# Altium footprint library SG__PCB_Modules.PcbLib: 73 footprints (part 3 of 5)
Each footprint in its own frame and in the unit in brackets; x right, y up, seen from the top. Pads: shape width x height; smd on the part's side, far side on the other; paste and mask are expansions set on the pad; w line width, h text height; cw(c..) or ccw(c..) is an arc to the next point about the centre after c.
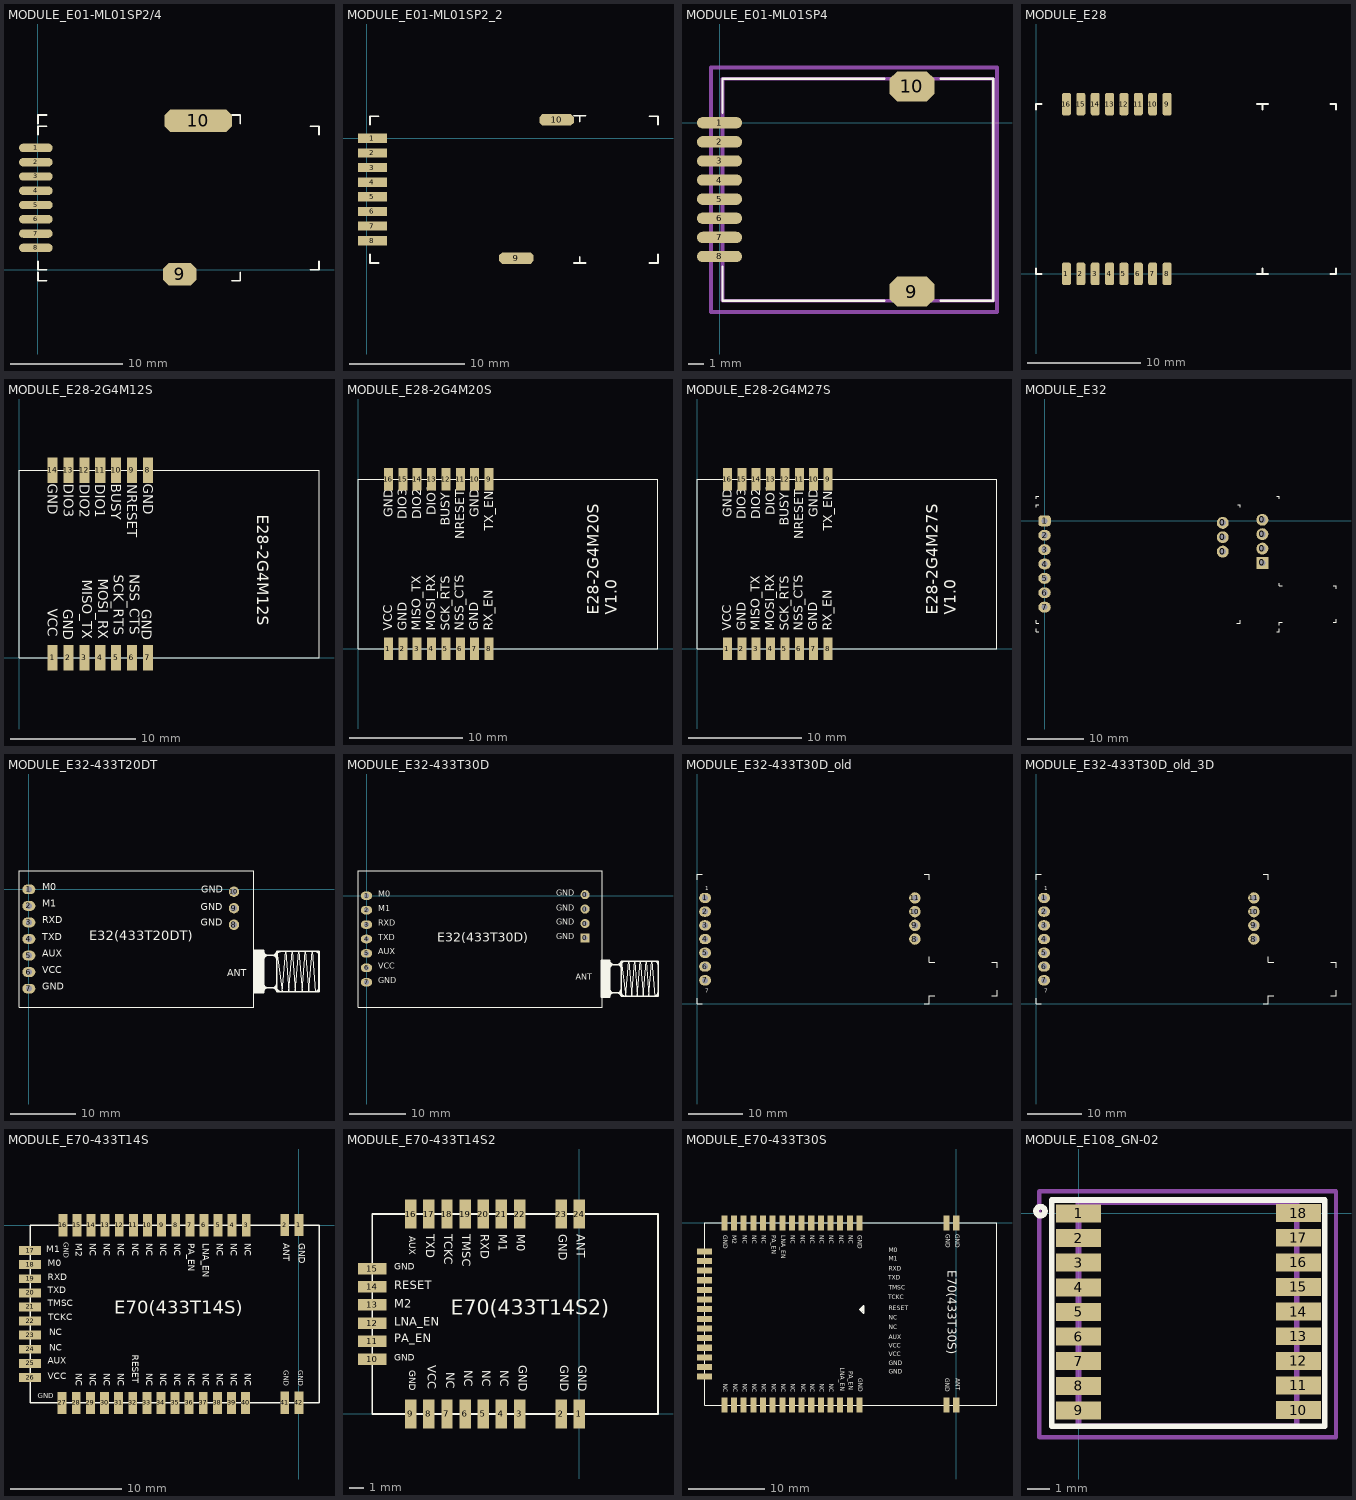
[diagram p2: the footprints below, top view; thin cyan lines are the x and y axes]

## MODULE_E01-ML01SP2/4 [mm]
height 2.25
pads (10):
  oval 3x0.75 smd: 1(-0.19,10.83) 2(-0.19,9.56) 3(-0.19,8.29) 4(-0.19,7.02) 5(-0.19,5.75) 6(-0.19,4.48) 7(-0.19,3.21) 8(-0.19,1.94)
  oct 3x2 smd: 9(12.6,-0.4)
  oct 6x2 smd: 10(14.25,13.25)
Top Overlay:
  lines w0.152: 0,-0.25 0,-1 0.75,-1 ; 0,0.75 0,0 0.75,0 ; 0,12 0,12.75 0.75,12.75 ; 0,13 0,13.75 0.75,13.75 ; 17.25,-1 18,-1 18,-0.25 ; 17.25,13.75 18,13.75 18,13 ; 24.25,0 25,0 25,0.75 ; 24.25,12.75 25,12.75 25,12
3D body: height 1.5, standoff 0, extent 0,0 25,12.8

## MODULE_E01-ML01SP2_2 [mm]
pads (10):
  rect 2.5x0.8 smd: 1(0.5,0) 2(0.5,-1.27) 3(0.5,-2.54) 4(0.5,-3.81) 5(0.5,-5.08) 6(0.5,-6.35) 7(0.5,-7.62) 8(0.5,-8.89)
  oct 3x1 smd: 9(13,-10.4) 10(16.5,1.6)
Top Overlay:
  lines w0.152: 0.3,-10.08 0.3,-10.83 1.05,-10.83 ; 0.3,1.17 0.3,1.92 1.05,1.92 ; 18,-10.83 19,-10.83 ; 18,1.97 19,1.97 ; 18.5,-10.83 18.5,-10.3 ; 18.5,1.44 18.5,1.97 ; 24.55,-10.83 25.3,-10.83 25.3,-10.08 ; 24.55,1.92 25.3,1.92 25.3,1.17
3D body: height 1.5, standoff 0, extent 0.5,-10.83 25.5,1.97

## MODULE_E01-ML01SP4 [mm]
height 2.25
pads (10):
  oval 3x0.75 smd: 1(0,0) 2(0,-1.27) 3(0,-2.54) 4(0,-3.81) 5(0,-5.08) 6(0,-6.35) 7(0,-7.62) 8(0,-8.89)
  oct 3x2 smd: 9(12.79,-11.23) 10(12.79,2.42)
Top Overlay:
  lines w0.152: 0.19,-9.58 0.19,-11.83 10.94,-11.83 ; 0.19,0.67 0.19,2.92 10.94,2.92 ; 14.69,-11.83 18.19,-11.83 18.19,2.92 14.69,2.92
Assembly Top:
  lines w0.254: 0.19,-11.83 0.19,2.92 18.19,2.92 18.19,-11.83 0.19,-11.83
Courtyard Top:
  lines w0.254: -0.56,-12.58 18.44,-12.58 18.44,3.67 -0.56,3.67 -0.56,-12.58
3D body "User Library-E01-ML01SP4.step": height 2.2, standoff 0, extent 0.204,-11.713 18.204,2.787

## MODULE_E28 [mm]
pads (16):
  rrect50% 0.8x2 smd: 1(2.69,0) 2(3.96,0) 3(5.23,0) 4(6.5,0) 5(7.77,0) 6(9.04,0) 7(10.31,0) 8(11.58,0) 9(11.58,15) 10(10.31,15) 11(9.04,15) 12(7.77,15) 13(6.5,15) 14(5.23,15) 15(3.96,15) 16(2.69,15)
Top Overlay:
  lines w0.152: 0,0.5 0,0 0.5,0 ; 0,14.5 0,15 0.5,15 ; 19.5,0 20,0 ; 19.5,15 20.5,15 ; 20,0.5 20,0 ; 20,14.5 20,15 ; 26,0 26.5,0 26.5,0.5 ; 26,15 26.5,15 26.5,14.5 ; 20,0 20.5,0 20,0
3D body: height 1, standoff 0, extent 0,0 26.5,15

## MODULE_E28-2G4M12S [mm]
pads (14):
  rect 0.8x2 smd: 1(2.69,0) 2(3.96,0) 3(5.23,0) 4(6.5,0) 5(7.77,0) 6(9.04,0) 7(10.31,0) 8(10.31,15) 9(9.04,15) 10(7.77,15) 11(6.5,15) 12(5.23,15) 13(3.96,15) 14(2.69,15)
Top Overlay:
  lines w0.1: 0,0 0,15 24,15 24,0 0,0
  text "E28-2G4M12S" at 19.05,11.43 h0.9
  text "GND" at 2.29,13.9 h0.8
  text "DIO3" at 3.567,13.9 h0.8
  text "DIO2" at 4.843,13.9 h0.8
  text "DIO1" at 6.12,13.9 h0.8
  text "BUSY" at 7.397,13.9 h0.8
  text "NRESET" at 8.673,13.9 h0.8
  text "GND" at 9.95,13.9 h0.8
  text "GND" at 9.84,3.883 h0.8
  text "NSS_CTS" at 8.85,6.69 h0.8
  text "SCK_RTS" at 7.593,6.648 h0.8
  text "MOSI_RX" at 6.337,6.313 h0.8
  text "MISO_TX" at 5.08,6.229 h0.8
  text "GND" at 3.557,3.883 h0.8
  text "VCC" at 2.3,3.921 h0.8

## MODULE_E28-2G4M20S [mm]
pads (16):
  rect 0.8x2 smd: 1(2.69,0) 2(3.96,0) 3(5.23,0) 4(6.5,0) 5(7.77,0) 6(9.04,0) 7(10.31,0) 8(11.58,0) 9(11.58,15) 10(10.31,15) 11(9.04,15) 12(7.77,15) 13(6.5,15) 14(5.23,15) 15(3.96,15) 16(2.69,15)
Top Overlay:
  lines w0.1: 0,0 26.5,0 26.5,15 0,15 0,0
  text "E28-2G4M20S" at 21.26,3.03 h1
  text "GND" at 3.05,11.61 h0.8
  text "DIO3" at 4.319,11.442 h0.8
  text "DIO2" at 5.587,11.442 h0.8
  text "DIO1" at 6.856,11.785 h0.8
  text "BUSY" at 8.124,10.863 h0.8
  text "NRESET" at 9.393,9.682 h0.8
  text "GND" at 10.661,11.61 h0.8
  text "GND" at 10.631,1.6 h0.8
  text "NSS_CTS" at 9.363,1.6 h0.8
  text "SCK_RTS" at 8.094,1.6 h0.8
  text "MOSI_RX" at 6.826,1.6 h0.8
  text "MISO_TX" at 5.557,1.6 h0.8
  text "GND" at 4.289,1.6 h0.8
  text "VCC" at 3.02,1.6 h0.8
  text "RX_EN" at 11.9,1.6 h0.8
  text "TX_EN" at 11.93,10.437 h0.8
  text "V1.0" at 22.85,3.03 h1

## MODULE_E28-2G4M27S [mm]
pads (16):
  rect 0.8x2 smd: 1(2.69,0) 2(3.96,0) 3(5.23,0) 4(6.5,0) 5(7.77,0) 6(9.04,0) 7(10.31,0) 8(11.58,0) 9(11.58,15) 10(10.31,15) 11(9.04,15) 12(7.77,15) 13(6.5,15) 14(5.23,15) 15(3.96,15) 16(2.69,15)
Top Overlay:
  lines w0.1: 0,0 0,15 26.5,15 26.5,0 0,0
  text "V1.0" at 22.85,3.03 h1
  text "TX_EN" at 11.93,10.437 h0.8
  text "RX_EN" at 11.9,1.6 h0.8
  text "VCC" at 3.02,1.6 h0.8
  text "GND" at 4.289,1.6 h0.8
  text "MISO_TX" at 5.557,1.6 h0.8
  text "MOSI_RX" at 6.826,1.6 h0.8
  text "SCK_RTS" at 8.094,1.6 h0.8
  text "NSS_CTS" at 9.363,1.6 h0.8
  text "GND" at 10.631,1.6 h0.8
  text "GND" at 10.661,11.61 h0.8
  text "NRESET" at 9.393,9.682 h0.8
  text "BUSY" at 8.124,10.863 h0.8
  text "DIO1" at 6.856,11.785 h0.8
  text "DIO2" at 5.587,11.442 h0.8
  text "DIO3" at 4.319,11.442 h0.8
  text "GND" at 3.05,11.61 h0.8
  text "E28-2G4M27S" at 21.26,3.03 h1

## MODULE_E32 [mm] "36mm*21mm-D/SMAі¤¶И12.5mm"
pads (14):
  round 2.1 hole 1.1: 0(31.49,-5.43) 0(31.49,-2.89) 0(31.49,-0.35) 0(38.5,-4.89) 0(38.5,-2.35) 0(38.5,0.19)
  rect 2.1x2.1 hole 1.1: 0(38.5,-7.43)
  rrect50% 2.2x1.9 hole 1.1: 1(0,0)
  oval 2.2x1.9 hole 1.1: 2(0,-2.54) 3(0,-5.08) 4(0,-7.62) 5(0,-10.16) 6(0,-12.7) 7(0,-15.24)
Top Overlay:
  lines w0.152: -1.51,-17.6 -1.51,-18.12 -1,-18.12 ; -1.51,2.4 -1.51,2.88 ; -1.5,-19.1 -1.5,-19.62 -1,-19.62 ; -1.5,3.9 -1.5,4.38 ; 34,-18.12 34.558,-18.12 ; 34.1,-18.12 34.558,-18.12 ; 34.1,2.88 34.558,2.88 ; 41,-19.62 41.5,-19.62 41.5,-19.1 ; 41,4.38 41.5,4.38 ; 41.5,-18.4 41.5,-17.9 42,-17.9 ; 41.5,-11 41.5,-11.5 42,-11.5 ; 51,-17.9 51.5,-17.9 51.5,-17.4 ; 51,-11.5 51.5,-11.5 51.5,-12 ; -1.51,2.88 -1,2.88 -1.51,2.88 ; -1.5,4.38 -1,4.38 -1.5,4.38 ; -1.5,4.38 -1.5,4.38 ; 34.558,-18.12 34.558,-17.6 34.558,-18.12 ; 34.558,2.88 34.558,2.4 34.558,2.88 ; 41.5,4.38 41.5,3.9 41.5,4.38
3D body: height 5, standoff -1, extent -0.25,-0.25 0.25,0.25
3D body: height 5, standoff -1, extent -0.25,-2.79 0.25,-2.29
3D body: height 5, standoff -1, extent -0.25,-5.33 0.25,-4.83
3D body: height 5, standoff -1, extent -0.25,-7.87 0.25,-7.37
3D body: height 5, standoff -1, extent -0.25,-10.41 0.25,-9.91
3D body: height 5, standoff -1, extent -0.25,-12.95 0.25,-12.45
3D body: height 5, standoff -1, extent -0.25,-15.49 0.25,-14.99
3D body: height 4.01, standoff 2.99, extent -0.794,-0.798 0.8,0.799
3D body: height 4.01, standoff 2.99, extent -0.794,-3.338 0.8,-1.741
3D body: height 4.01, standoff 2.99, extent -0.794,-5.878 0.8,-4.281
3D body: height 4.01, standoff 2.99, extent -0.794,-8.418 0.8,-6.821
3D body: height 4.01, standoff 2.99, extent -0.794,-10.958 0.8,-9.361
3D body: height 4.01, standoff 2.99, extent -0.794,-13.498 0.8,-11.901
3D body: height 4.01, standoff 2.99, extent -0.794,-16.038 0.8,-14.441
3D body: height 6.82, standoff 3.92, extent 1.5,-18.6 36.5,3.4
3D body: height 4, standoff 3, extent -1.5,-19.6 41.5,4.4
3D body: height 5, standoff -1, extent 38.55,-7.87 39.05,-7.37
3D body: height 5, standoff -1, extent 38.55,-5.33 39.05,-4.83
3D body: height 5, standoff -1, extent 38.55,-2.79 39.05,-2.29
3D body: height 5, standoff -1, extent 38.55,-0.25 39.05,0.25
3D body: height 4.01, standoff 2.99, extent 38.007,-8.418 39.6,-6.821
3D body: height 4.01, standoff 2.99, extent 38.007,-5.878 39.6,-4.281
3D body: height 4.01, standoff 2.99, extent 38.007,-3.338 39.6,-1.741
3D body: height 4.01, standoff 2.99, extent 38.007,-0.798 39.6,0.799
3D body: height 4.9, standoff 3.9, extent 38.7,-15.5 42.7,-14.502
3D body: height 7.2, standoff 1, extent 40.5,-18.1 54,-11.9

## MODULE_E32-433T20DT [mm] "36mm*21mm-D/SMAі¤¶И12.5mm"
pads (10):
  oval 2x1.5 hole 0.9: 1(0,0) 2(0,-2.54) 3(0,-5.08) 4(0,-7.62) 5(0,-10.16) 6(0,-12.7) 7(0,-15.24)
  round 1.6 hole 1: 8(31.49,-5.43) 9(31.49,-2.89) 10(31.49,-0.35)
Top Overlay:
  rectangle: 34.54,-15.865 36.04,-9.365
  rectangle: 34.54,-15.87 36.04,-9.37
  lines w0.1: 38.89,-15.72 38.04,-9.52 38.89,-15.72 ; 38.89,-15.72 39.41,-9.52 ; 38.89,-15.72 39.41,-9.52 ; 39.41,-9.52 39.92,-15.72 ; 39.41,-9.52 39.92,-15.72 ; 39.92,-15.72 40.43,-9.52 ; 39.92,-15.72 40.43,-9.52 ; 40.43,-9.52 40.91,-15.72 ; 40.43,-9.52 40.91,-15.72 ; 40.91,-15.72 41.43,-9.52 ; 40.91,-15.72 41.43,-9.52 ; 41.43,-9.52 41.94,-15.72 ; 41.43,-9.52 41.94,-15.72 ; 41.94,-15.72 42.43,-9.52 ; 41.94,-15.72 42.43,-9.52 ; 42.43,-9.52 42.95,-15.72 ; 42.43,-9.52 42.95,-15.72 ; 42.95,-15.72 43.47,-9.52 ; 42.95,-15.72 43.47,-9.52 ; 43.47,-9.52 43.98,-15.72 43.47,-9.52 ; -1.51,-18.12 -1.51,2.88 34.558,2.88 34.558,-18.12 -1.51,-18.12
  lines w0.254: 34.54,-15.87 34.54,-9.37 ; 34.54,-15.87 36.04,-15.87 ; 34.54,-15.87 34.54,-9.37 ; 34.54,-15.87 36.04,-15.87 ; 34.54,-9.37 36.04,-9.37 ; 34.54,-9.37 36.04,-9.37 ; 36.04,-15.87 36.04,-9.37 ; 36.04,-15.87 36.04,-9.37 ; 36.04,-14.47 ccw(c36.69,-14.47) 36.69,-15.12 ; 36.04,-14.47 ccw(c36.69,-14.47) 36.69,-15.12 ; 36.04,-14.47 36.04,-14.1 36.04,-14.47 ; 36.04,-10.82 cw(c36.74,-10.82) 36.74,-10.12 ; 36.04,-10.82 cw(c36.74,-10.82) 36.74,-10.12 ; 36.04,-10.82 36.04,-11.74 36.04,-10.82 ; 36.04,-9.49 ccw(c36.67,-9.49) 36.67,-10.12 ; 36.04,-9.49 ccw(c36.67,-9.49) 36.67,-10.12 ; 36.04,-9.49 36.04,-9.37 ; 36.04,-9.49 36.04,-9.37 ; 36.59,-15.12 ccw(c36.59,-15.67) 36.04,-15.67 cw(c36.59,-15.67) 36.59,-15.12 ; 36.59,-15.12 37.44,-15.12 ; 36.59,-15.12 37.44,-15.12 ; 36.67,-10.12 37.44,-10.12 ; 36.67,-10.12 37.44,-10.12 ; 36.69,-15.12 37.41,-15.12 ; 36.69,-15.12 37.41,-15.12 ; 36.74,-10.12 37.44,-10.12 ; 36.74,-10.12 37.44,-10.12 ; 37.41,-15.12 ccw(c37.41,-14.49) 38.04,-14.49 cw(c37.41,-14.49) 37.41,-15.12 ; 37.44,-15.12 cw(c37.44,-15.72) 38.04,-15.72 ; 37.44,-15.12 cw(c37.44,-15.72) 38.04,-15.72 ; 37.44,-10.12 ccw(c37.44,-9.52) 38.04,-9.52 ; 37.44,-10.12 cw(c37.44,-10.72) 38.04,-10.72 ccw(c37.44,-10.72) 37.44,-10.12 ; 37.44,-10.12 ccw(c37.44,-9.52) 38.04,-9.52 ; 38.04,-15.72 44.54,-15.72 ; 38.04,-15.72 38.04,-9.52 ; 38.04,-15.72 44.54,-15.72 ; 38.04,-15.72 38.04,-9.52 ; 38.04,-9.52 44.54,-9.52 ; 38.04,-9.52 44.54,-9.52 ; 38.72,-15.72 cw(c38.72,-15.04) 38.04,-15.04 ccw(c38.72,-15.04) 38.72,-15.72 ; 38.72,-15.72 38.87,-15.72 38.72,-15.72 ; 43.92,-15.72 ccw(c43.92,-15.1) 44.54,-15.1 cw(c43.92,-15.1) 43.92,-15.72 ; 43.92,-15.72 43.69,-15.72 43.92,-15.72 ; 44,-9.52 cw(c44,-10.06) 44.54,-10.06 ccw(c44,-10.06) 44,-9.52 ; 44,-9.52 43.6,-9.52 44,-9.52 ; 44.54,-15.72 44.54,-9.52 ; 44.54,-15.72 44.54,-9.52 ; 35.87,-15.12 38.04,-15.12 35.87,-15.12 ; 36.04,-10.12 38.04,-10.12 36.04,-10.12 ; 38.04,-10.13 cw(c38.65,-10.13) 38.65,-9.52 ccw(c38.65,-10.13) 38.04,-10.13
  text "E32(433T20DT)" at 9.271,-8.382 h2.5
  text "GND" at 26.416,-5.969 h1.8
  text "GND" at 26.416,-3.556 h1.8
  text "GND" at 26.447,-0.921 h1.8
  text "ANT" at 30.48,-13.716 h1.8
  text "M0" at 2.063,-0.54 h1.8
  text "M1" at 2.063,-3.08 h1.8
  text "RXD" at 2.063,-5.62 h1.8
  text "TXD" at 2.063,-8.16 h1.8
  text "AUX" at 2.063,-10.7 h1.8
  text "VCC" at 2.063,-13.24 h1.8
  text "GND" at 2.063,-15.78 h1.8

## MODULE_E32-433T30D [mm] "43MM*24mm-D//SMAі¤¶И12.5mm"
pads (11):
  rect 1.6x1.6 hole 0.9: 0(38.5,-7.43)
  round 1.6 hole 0.9: 0(38.5,-4.89) 0(38.5,-2.35) 0(38.5,0.19)
  oval 2x1.5 hole 0.9: 1(0,0) 2(0,-2.54) 3(0,-5.08) 4(0,-7.62) 5(0,-10.16) 6(0,-12.7) 7(0,-15.24)
Top Overlay:
  rectangle: 41.35,-17.865 42.85,-11.365
  rectangle: 41.35,-17.87 42.85,-11.37
  lines w0.1: 45.7,-17.72 44.85,-11.52 45.7,-17.72 ; 45.7,-17.72 46.22,-11.52 ; 45.7,-17.72 46.22,-11.52 ; 46.22,-11.52 46.73,-17.72 ; 46.22,-11.52 46.73,-17.72 ; 46.73,-17.72 47.24,-11.52 ; 46.73,-17.72 47.24,-11.52 ; 47.24,-11.52 47.72,-17.72 ; 47.24,-11.52 47.72,-17.72 ; 47.72,-17.72 48.24,-11.52 ; 47.72,-17.72 48.24,-11.52 ; 48.24,-11.52 48.75,-17.72 ; 48.24,-11.52 48.75,-17.72 ; 48.75,-17.72 49.24,-11.52 ; 48.75,-17.72 49.24,-11.52 ; 49.24,-11.52 49.76,-17.72 ; 49.24,-11.52 49.76,-17.72 ; 49.76,-17.72 50.28,-11.52 ; 49.76,-17.72 50.28,-11.52 ; 50.28,-11.52 50.79,-17.72 50.28,-11.52 ; -1.5,-19.62 -1.5,4.38 41.5,4.38 41.5,-19.62 -1.5,-19.62
  lines w0.254: 41.35,-17.87 41.35,-11.37 ; 41.35,-17.87 42.85,-17.87 ; 41.35,-17.87 41.35,-11.37 ; 41.35,-17.87 42.85,-17.87 ; 41.35,-11.37 42.85,-11.37 ; 41.35,-11.37 42.85,-11.37 ; 42.85,-17.87 42.85,-11.37 ; 42.85,-17.87 42.85,-11.37 ; 42.85,-16.47 ccw(c43.5,-16.47) 43.5,-17.12 ; 42.85,-16.47 ccw(c43.5,-16.47) 43.5,-17.12 ; 42.85,-16.47 42.85,-16.1 42.85,-16.47 ; 42.85,-12.82 cw(c43.55,-12.82) 43.55,-12.12 ; 42.85,-12.82 cw(c43.55,-12.82) 43.55,-12.12 ; 42.85,-12.82 42.85,-13.74 42.85,-12.82 ; 42.85,-11.49 ccw(c43.48,-11.49) 43.48,-12.12 ; 42.85,-11.49 ccw(c43.48,-11.49) 43.48,-12.12 ; 42.85,-11.49 42.85,-11.37 ; 42.85,-11.49 42.85,-11.37 ; 43.4,-17.12 ccw(c43.4,-17.67) 42.85,-17.67 cw(c43.4,-17.67) 43.4,-17.12 ; 43.4,-17.12 44.25,-17.12 ; 43.4,-17.12 44.25,-17.12 ; 43.48,-12.12 44.25,-12.12 ; 43.48,-12.12 44.25,-12.12 ; 43.5,-17.12 44.22,-17.12 ; 43.5,-17.12 44.22,-17.12 ; 43.55,-12.12 44.25,-12.12 ; 43.55,-12.12 44.25,-12.12 ; 44.22,-17.12 ccw(c44.22,-16.49) 44.85,-16.49 cw(c44.22,-16.49) 44.22,-17.12 ; 44.25,-17.12 cw(c44.25,-17.72) 44.85,-17.72 ; 44.25,-17.12 cw(c44.25,-17.72) 44.85,-17.72 ; 44.25,-12.12 ccw(c44.25,-11.52) 44.85,-11.52 ; 44.25,-12.12 cw(c44.25,-12.72) 44.85,-12.72 ccw(c44.25,-12.72) 44.25,-12.12 ; 44.25,-12.12 ccw(c44.25,-11.52) 44.85,-11.52 ; 44.85,-17.72 51.35,-17.72 ; 44.85,-17.72 44.85,-11.52 ; 44.85,-17.72 51.35,-17.72 ; 44.85,-17.72 44.85,-11.52 ; 44.85,-11.52 51.35,-11.52 ; 44.85,-11.52 51.35,-11.52 ; 45.53,-17.72 cw(c45.53,-17.04) 44.85,-17.04 ccw(c45.53,-17.04) 45.53,-17.72 ; 45.53,-17.72 45.68,-17.72 45.53,-17.72 ; 50.73,-17.72 ccw(c50.73,-17.1) 51.35,-17.1 cw(c50.73,-17.1) 50.73,-17.72 ; 50.73,-17.72 50.5,-17.72 50.73,-17.72 ; 50.81,-11.52 cw(c50.81,-12.06) 51.35,-12.06 ccw(c50.81,-12.06) 50.81,-11.52 ; 50.81,-11.52 50.41,-11.52 50.81,-11.52 ; 51.35,-17.72 51.35,-11.52 ; 51.35,-17.72 51.35,-11.52 ; 42.68,-17.12 44.85,-17.12 42.68,-17.12 ; 42.85,-12.12 44.85,-12.12 42.85,-12.12 ; 44.85,-12.13 cw(c45.46,-12.13) 45.46,-11.52 ccw(c45.46,-12.13) 44.85,-12.13
  text "GND" at 33.457,-8.001 h1.8
  text "GND" at 33.457,-0.381 h1.8
  text "GND" at 33.426,-3.016 h1.8
  text "GND" at 33.426,-5.429 h1.8
  text "GND" at 2.063,-15.78 h1.8
  text "VCC" at 2.063,-13.24 h1.8
  text "AUX" at 2.063,-10.7 h1.8
  text "TXD" at 2.063,-8.16 h1.8
  text "RXD" at 2.063,-5.62 h1.8
  text "M1" at 2.063,-3.08 h1.8
  text "M0" at 2.063,-0.54 h1.8
  text "ANT" at 36.83,-15.19 h1.8
  text "E32(433T30D)" at 12.446,-8.763 h2.8
3D body "e32-433t30d.STEP": height 8, standoff -5.51, extent -1.445,-19.62 51.055,4.38

## MODULE_E32-433T30D_old [mm]
height 1
pads (11):
  oval 2.2x1.9 hole 1.1 paste-2539.97 mask+0: 1(1.5,19.6) 2(1.5,17.06) 3(1.5,14.52) 4(1.5,11.98) 5(1.5,9.44) 6(1.5,6.9) 7(1.5,4.36)
  round 2.1 hole 1.1 paste-2539.97 mask+0: 8(40.3,11.98) 9(40.3,14.52) 10(40.3,17.06) 11(40.3,19.6)
Top Overlay:
  lines w0.152: 0,1 0,0 1,0 ; 0,23 0,24 1,24 ; 42,0 43,0 43,1 ; 42,24 43,24 43,23 ; 43,0.5 43,1.5 44,1.5 ; 43,8.7 43,7.7 44,7.7 ; 54.5,1.5 55.5,1.5 55.5,2.5 ; 54.5,7.7 55.5,7.7 55.5,6.7
  text "7" at 1.5,2.05 h0.76
  text "1" at 1.5,21.05 h0.76
3D body "e32-433t30d.STEP": height 8, standoff -5.51, extent 0.055,0 52.555,24

## MODULE_E32-433T30D_old_3D [mm]
height 1
pads (11):
  oval 2.2x1.9 hole 1.1 paste-2539.97 mask+0: 1(1.5,19.6) 2(1.5,17.06) 3(1.5,14.52) 4(1.5,11.98) 5(1.5,9.44) 6(1.5,6.9) 7(1.5,4.36)
  round 2.1 hole 1.1 paste-2539.97 mask+0: 8(40.3,11.98) 9(40.3,14.52) 10(40.3,17.06) 11(40.3,19.6)
Top Overlay:
  lines w0.152: 0,1 0,0 1,0 ; 0,23 0,24 1,24 ; 42,0 43,0 43,1 ; 42,24 43,24 43,23 ; 43,0.5 43,1.5 44,1.5 ; 43,8.7 43,7.7 44,7.7 ; 54.5,1.5 55.5,1.5 55.5,2.5 ; 54.5,7.7 55.5,7.7 55.5,6.7
  text "1" at 1.5,21.05 h0.76
  text "7" at 1.5,2.05 h0.76
3D body: height 5, standoff -1, extent 1.25,4.11 1.75,4.61
3D body: height 5, standoff -1, extent 1.25,6.65 1.75,7.15
3D body: height 5, standoff -1, extent 1.25,9.19 1.75,9.69
3D body: height 5, standoff -1, extent 1.25,11.73 1.75,12.23
3D body: height 5, standoff -1, extent 1.25,14.27 1.75,14.77
3D body: height 5, standoff -1, extent 1.25,16.81 1.75,17.31
3D body: height 5, standoff -1, extent 1.25,19.35 1.75,19.85
3D body: height 4.01, standoff 2.99, extent 0.706,3.562 2.3,5.159
3D body: height 4.01, standoff 2.99, extent 0.706,6.102 2.3,7.699
3D body: height 4.01, standoff 2.99, extent 0.706,8.642 2.3,10.239
3D body: height 4.01, standoff 2.99, extent 0.706,11.182 2.3,12.779
3D body: height 4.01, standoff 2.99, extent 0.706,13.722 2.3,15.319
3D body: height 4.01, standoff 2.99, extent 0.706,16.262 2.3,17.859
3D body: height 4.01, standoff 2.99, extent 0.706,18.802 2.3,20.399
3D body: height 6.82, standoff 3.92, extent 3,1 38,23
3D body: height 4, standoff 3, extent 0,0 43,24
3D body: height 5, standoff -1, extent 40.05,19.35 40.55,19.85
3D body: height 5, standoff -1, extent 40.05,16.81 40.55,17.31
3D body: height 5, standoff -1, extent 40.05,14.27 40.55,14.77
3D body: height 5, standoff -1, extent 40.05,11.73 40.55,12.23
3D body: height 4.01, standoff 2.99, extent 39.506,18.802 41.1,20.399
3D body: height 4.01, standoff 2.99, extent 39.506,16.262 41.1,17.859
3D body: height 4.01, standoff 2.99, extent 39.506,13.722 41.1,15.319
3D body: height 4.01, standoff 2.99, extent 39.506,11.182 41.1,12.779
3D body: height 4.9, standoff 3.9, extent 40.2,4.1 44.2,5.098
3D body: height 7.2, standoff 1, extent 42,1.5 55.5,7.7

## MODULE_E70-433T14S [mm] "26mm*16mm*2.4mm-S"
pads (42):
  rect 0.8x2 smd: 1(0,0) 2(-1.27,0) 3(-4.735,-0.006) 4(-6.005,-0.006) 5(-7.275,-0.006) 6(-8.545,-0.006) 7(-9.815,-0.006) 8(-11.085,-0.006) 9(-12.355,-0.006) 10(-13.625,-0.006) 11(-14.895,-0.006) 12(-16.165,-0.006) 13(-17.435,-0.006) 14(-18.705,-0.006) 15(-19.975,-0.006) 16(-21.245,-0.006) 27(-21.303,-16.007) 28(-20.033,-16.007) 29(-18.763,-16.007) 30(-17.493,-16.007) 31(-16.223,-16.007) 32(-14.953,-16.007) 33(-13.683,-16.007) 34(-12.413,-16.007) 35(-11.143,-16.007) 36(-9.873,-16.007) 37(-8.603,-16.007) 38(-7.333,-16.007) 39(-6.063,-16.007) 40(-4.793,-16.007) 41(-1.27,-15.996) 42(0,-15.996)
  rect 2x0.8 smd: 17(-24.19,-2.291) 18(-24.19,-3.561) 19(-24.19,-4.831) 20(-24.19,-6.101) 21(-24.19,-7.371) 22(-24.19,-8.641) 23(-24.19,-9.911) 24(-24.19,-11.181) 25(-24.19,-12.451) 26(-24.19,-13.721)
Top Overlay:
  lines w0.127: -24.19,-16.006 -24.19,-0.006 1.81,-0.006 1.81,-16.006 -24.19,-16.006
  text "E70(433T14S)" at -16.637,-8.382 h2
  text "NC" at -16.51,-13.335 h1
  text "NC" at -17.78,-13.335 h1
  text "NC" at -19.05,-13.335 h1
  text "NC" at -20.32,-13.335 h1
  text "TMSC" at -22.594,-7.528 h1
  text "RESET" at -15.24,-11.684 h1
  text "VCC" at -22.606,-14.097 h1
  text "AUX" at -22.606,-12.7 h1
  text "TCKC" at -22.546,-8.801 h1
  text "M1" at -22.733,-2.667 h1
  text "M2" at -20.32,-1.651 h1
  text "PA_EN" at -10.16,-1.651 h1
  text "LNA_EN" at -8.89,-1.651 h1
  text "NC" at -5.08,-1.651 h1
  text "ANT" at -1.651,-1.651 h1
  text "GND" at -0.254,-1.651 h1
  text "NC" at -6.35,-1.651 h1
  text "NC" at -7.62,-1.651 h1
  text "NC" at -11.43,-1.651 h1
  text "NC" at -12.7,-1.651 h1
  text "NC" at -13.97,-1.651 h1
  text "NC" at -15.24,-1.651 h1
  text "NC" at -16.51,-1.651 h1
  text "NC" at -17.78,-1.651 h1
  text "NC" at -19.05,-1.651 h1
  text "GND" at -21.336,-1.524 h0.8
  text "M0" at -22.606,-3.937 h1
  text "RXD" at -22.606,-5.207 h1
  text "TXD" at -22.606,-6.35 h1
  text "NC" at -22.479,-10.16 h1
  text "NC" at -22.479,-11.557 h1
  text "GND" at -23.495,-15.748 h0.8
  text "NC" at -13.97,-13.335 h1
  text "NC" at -12.7,-13.335 h1
  text "NC" at -11.43,-13.335 h1
  text "NC" at -10.16,-13.335 h1
  text "NC" at -8.89,-13.335 h1
  text "NC" at -7.62,-13.335 h1
  text "NC" at -6.35,-13.335 h1
  text "NC" at -5.08,-13.335 h1
  text "GND" at -1.524,-13.081 h0.8
  text "GND" at -0.254,-13.081 h0.8

## MODULE_E70-433T14S2 [mm] "20mm*14mm*2.57mm-S"
pads (24):
  rect 0.8x2 smd: 1(0,0) 2(-1.27,0) 3(-4.19,0) 4(-5.46,0) 5(-6.73,0) 6(-8,0) 7(-9.27,0) 8(-10.54,0) 9(-11.81,0) 16(-11.81,14) 17(-10.54,14) 18(-9.27,14) 19(-8,14) 20(-6.73,14) 21(-5.46,14) 22(-4.19,14) 23(-1.27,14) 24(0,14)
  rect 2x0.8 smd: 10(-14.5,3.825) 11(-14.5,5.095) 12(-14.5,6.365) 13(-14.5,7.635) 14(-14.5,8.905) 15(-14.5,10.175)
Top Overlay:
  lines w0.127: -14.5,0 -14.5,14 5.5,14 5.5,0 -14.5,0
  text "ANT" at -0.403,12.573 h1
  text "GND" at -1.673,12.573 h1
  text "RXD" at -7.134,12.573 h1
  text "TMSC" at -8.404,12.573 h1
  text "RESET" at -12.976,8.509 h1
  text "LNA_EN" at -12.976,5.969 h1
  text "GND" at -12.976,3.556 h0.8
  text "GND" at -12.087,3.048 h0.8
  text "VCC" at -10.817,3.429 h1
  text "NC" at -9.547,2.921 h1
  text "NC" at -8.277,3.048 h1
  text "NC" at -7.007,3.048 h1
  text "NC" at -5.737,3.048 h1
  text "GND" at -1.546,3.429 h1
  text "E70(433T14S2)" at -9.017,6.604 h1.8
  text "GND" at -0.276,3.429 h1
  text "GND" at -4.467,3.429 h1
  text "PA_EN" at -12.976,4.826 h1
  text "M2" at -12.976,7.239 h1
  text "GND" at -12.976,9.906 h0.8
  text "AUX" at -12.087,12.446 h0.8
  text "TXD" at -10.944,12.573 h1
  text "TCKC" at -9.674,12.573 h1
  text "M1" at -5.864,12.573 h1
  text "M0" at -4.594,12.573 h1

## MODULE_E70-433T30S [mm] "38.5mm*24mm*3.80mm-S"
pads (48):
  rect 0.8x2 smd: 1(0,0) 2(-1.27,0) 3(-12.745,0) 4(-14.015,0) 5(-15.285,0) 6(-16.555,0) 7(-17.825,0) 8(-19.095,0) 9(-20.365,0) 10(-21.635,0) 11(-22.905,0) 12(-24.175,0) 13(-25.445,0) 14(-26.715,0) 15(-27.985,0) 16(-29.255,0) 17(-30.525,0) 32(-30.525,-24) 33(-29.255,-24) 34(-27.985,-24) 35(-26.715,-24) 36(-25.445,-24) 37(-24.175,-24) 38(-22.905,-24) 39(-21.635,-24) 40(-20.365,-24) 41(-19.095,-24) 42(-17.825,-24) 43(-16.555,-24) 44(-15.285,-24) 45(-14.015,-24) 46(-12.745,-24) 47(-1.27,-24) 48(0,-24)
  rect 2x0.8 smd: 18(-33.135,-3.745) 19(-33.135,-5.015) 20(-33.135,-6.285) 21(-33.135,-7.555) 22(-33.135,-8.825) 23(-33.135,-10.095) 24(-33.135,-11.365) 25(-33.135,-12.635) 26(-33.135,-13.905) 27(-33.135,-15.175) 28(-33.135,-16.445) 29(-33.135,-17.715) 30(-33.135,-18.985) 31(-33.135,-20.255)
Top Overlay:
  lines w0.127: -33.135,-24 5.365,-24 5.365,0 -33.135,0 -33.135,-24
  lines w0.2: -12.708,-11.41 -12.202,-11.916 -12.202,-10.908 -12.703,-11.41 ; -12.342,-11.493 -12.342,-11.248 -12.317,-11.222 -12.337,-11.222 -12.475,-11.36 -12.475,-11.406 -12.271,-11.61 -12.271,-11.784
  text "E70(433T30S)" at -1.524,-6.22 h2
  text "PA_EN" at -14.351,-19.555 h1
  text "NC" at -16.891,-21.206 h1
  text "NC" at -18.161,-21.206 h1
  text "NC" at -19.431,-21.206 h1
  text "NC" at -20.574,-21.206 h1
  text "NC" at -21.971,-21.206 h1
  text "NC" at -23.241,-21.206 h1
  text "NC" at -24.511,-21.206 h1
  text "NC" at -25.781,-21.206 h1
  text "NC" at -27.051,-21.206 h1
  text "NC" at -28.321,-21.206 h1
  text "NC" at -29.591,-21.206 h1
  text "NC" at -30.861,-21.206 h1
  text "AUX" at -8.89,-15.491 h1
  text "NC" at -8.89,-12.951 h1
  text "TXD" at -8.928,-7.693 h1
  text "M1" at -8.89,-5.204 h1
  text "M0" at -8.89,-4.061 h1
  text "NC" at -21.971,-1.648 h1
  text "NC" at -20.701,-1.648 h1
  text "NC" at -19.431,-1.648 h1
  text "NC" at -18.161,-1.648 h1
  text "NC" at -16.891,-1.648 h1
  text "NC" at -14.351,-1.648 h1
  text "GND" at -13.081,-20.444 h1
  text "LNA_EN" at -23.241,-1.648 h1
  text "PA_EN" at -24.511,-1.648 h1
  text "M2" at -29.667,-1.61 h1
  text "GND" at -0.341,-1.482 h1
  text "TMSC" at -8.904,-8.977 h1
  text "TCKC" at -8.934,-10.257 h1
  text "VCC" at -8.89,-16.634 h1
  text "RESET" at -8.89,-11.681 h1
  text "GND" at -13.147,-1.612 h1
  text "GND" at -1.611,-1.492 h1
  text "VCC" at -8.89,-17.777 h1
  text "ANT" at -0.254,-20.444 h1
  text "GND" at -30.861,-1.648 h1
  text "GND" at -8.89,-18.92 h1
  text "GND" at -8.89,-20.063 h1
  text "GND" at -1.651,-20.444 h1
  text "NC" at -15.621,-1.648 h1
  text "NC" at -25.781,-1.648 h1
  text "NC" at -27.051,-1.648 h1
  text "NC" at -28.321,-1.648 h1
  text "RXD" at -8.89,-6.474 h1
  text "NC" at -8.89,-14.221 h1
  text "LNA_EN" at -15.494,-19.047 h1

## MODULE_E108_GN-02 [mm]
pads (18):
  rect 2x0.8 smd: 1(0,0) 2(0,-1.1) 3(0,-2.2) 4(0,-3.3) 5(0,-4.4) 6(0,-5.5) 7(0,-6.6) 8(0,-7.7) 9(0,-8.8) 10(9.824,-8.785) 11(9.824,-7.685) 12(9.824,-6.585) 13(9.824,-5.485) 14(9.824,-4.385) 15(9.824,-3.285) 16(9.824,-2.185) 17(9.824,-1.085) 18(9.824,0.015)
Top Overlay:
  circle w0.254: c-1.7,0.1 r0.2
  lines w0.254: -1.2,-9.5 -1.2,0.6 11,0.6 11,-9.5 -1.2,-9.5
Assembly Top:
  lines w0.254: 0,-9.5 9.75,-9.5 9.75,0.5 0,0.5 0,-9.5
Courtyard Top:
  lines w0.2: -1.75,-10 -1.25,-10 11.5,-10 11.5,1 -1.75,1 -1.75,-10
Top Designator:
  text ".Designator" at 0.002,-4.833 h1
3D body: height 2, standoff 0.1, extent 0.05,-9.5 9.75,0.6